# Altium footprint library TarabusLibrary.PcbLib: 591 footprints (part 19 of 37)
Each footprint in its own frame and in the unit in brackets; x right, y up, seen from the top. Pads: shape width x height; smd on the part's side, far side on the other; paste and mask are expansions set on the pad; w line width, h text height; cw(c..) or ccw(c..) is an arc to the next point about the centre after c.
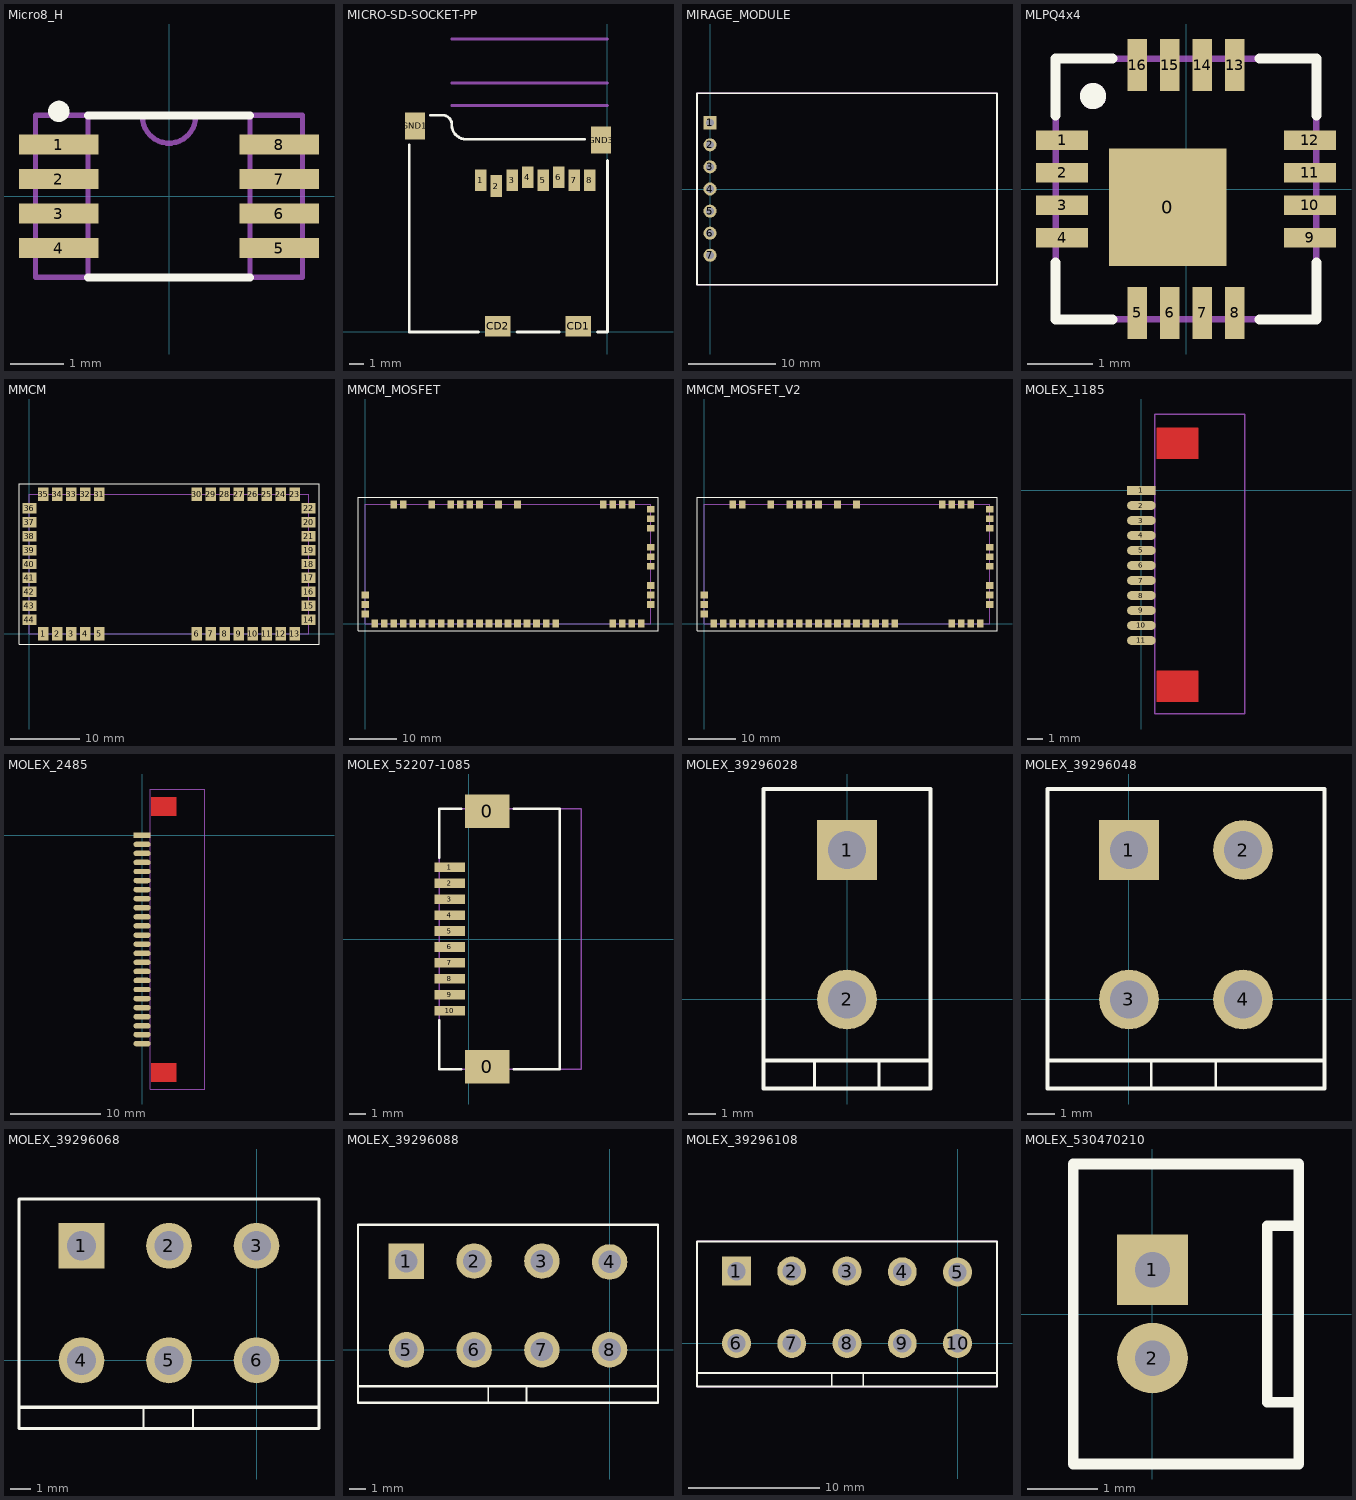
[diagram p18: the footprints below, top view; thin cyan lines are the x and y axes]

## Micro8_H [mm]
height 1.11
pads (8):
  rect 1.5x0.38 smd: 1(-2.075,0.975) 2(-2.075,0.325) 3(-2.075,-0.325) 4(-2.075,-0.975) 5(2.075,-0.975) 6(2.075,-0.325) 7(2.075,0.325) 8(2.075,0.975)
Top Overlay:
  circle w0.2: c-2.075,1.6 r0.1
  lines w0.15: -1.525,-1.525 1.525,-1.525 ; -1.525,1.525 1.525,1.525
Mechanical 7:
  lines w0.1: -1.525,-1.525 -1.525,1.525 ; -0.499,1.525 ccw(c0,1.5) 0.499,1.525 ; 1.525,-1.525 1.525,1.525 ; -2.515,-1.525 -2.515,1.525 2.515,1.525 2.515,-1.525 -2.515,-1.525
Mechanical 10:
  text ".Comment" at -0.67,-2.26 h0.6
  text ".Designator" at -0.67,2.04 h0.8
3D body: height 0.7, standoff 0, extent -2.515,-1.525 -1.525,1.525
3D body: height 0.7, standoff 0, extent 1.525,-1.525 2.515,1.525
3D body: height 1.11, standoff 0, extent -1.525,-1.525 1.525,1.525

## MICRO-SD-SOCKET-PP [mil] "MICRO-SD-SOCKET-PP"
pads (12):
  rect 32x60 smd: 1(-351.97,422) 2(-308.66,406) 3(-265.35,422) 4(-222.05,430) 5(-178.74,422) 6(-135.43,430) 7(-92.13,422) 8(-48.82,422)
  rect 71x56 smd: CD1(-80.71,16) CD2(-305.12,16)
  rect 56x75 smd: GND1(-535.43,573) GND3(-17.72,534)
Top Overlay:
  lines w8: -551.18,520 -551.18,0 -358.27,0 ; -492.13,603 -460.63,603 cw(c-458.85,577.19) -433.07,575 ccw(c-392.91,576.17) -393.7,536 -62.99,536 ; -251.97,0 -133.86,0 ; -27.56,0 0,0 0,477
Mechanical 2:
  text ">Name" at -350,250 h49.6
Mechanical 4:
  text ">Value" at -350,200 h49.6
Mechanical 16:
  lines w8: -433.07,630 0,630 ; -433.07,693 0,693 ; -433.07,815 0,815

## MIRAGE_MODULE [mm]
pads (7):
  rect 1.5x1.5 hole 0.9: 1(0,7.62)
  round 1.5 hole 0.9: 2(0,5.08) 3(0,2.54) 4(0,0) 5(0,-2.54) 6(0,-5.08) 7(0,-7.62)
Top Overlay:
  lines w0.2: -1.5,-11 33,-11 33,11 -1.5,11 -1.5,-11
Mechanical 7:
  lines w0.2: -1.5,-11 -1.5,11 33,11 33,-11 -1.5,-11
3D body: height 7, standoff 3, extent 2,-11 33,11
3D body: height 3, standoff 0, extent -1.5,-11 2,11
3D body: height 4, standoff 3, extent -1.5,-11 2,11
3D body: height 5, standoff -3, extent -0.3,7.3 0.3,7.9
3D body: height 5, standoff -3, extent -0.3,4.78 0.3,5.38
3D body: height 5, standoff -3, extent -0.3,2.22 0.3,2.82
3D body: height 5, standoff -3, extent -0.3,-0.32 0.3,0.28
3D body: height 5, standoff -3, extent -0.3,-2.86 0.3,-2.26
3D body: height 5, standoff -3, extent -0.3,-5.4 0.3,-4.8
3D body: height 5, standoff -3, extent -0.3,-7.94 0.3,-7.34

## MLPQ4x4 [mm]
height 1
pads (17):
  rect 1.8x1.8 smd: 0(-0.28,-0.28)
  rect 0.8x0.3 smd: 1(-1.9,0.75) 2(-1.9,0.25) 3(-1.9,-0.25) 4(-1.9,-0.75) 9(1.9,-0.75) 10(1.9,-0.25) 11(1.9,0.25) 12(1.9,0.75)
  rect 0.3x0.8 smd: 5(-0.75,-1.9) 6(-0.25,-1.9) 7(0.25,-1.9) 8(0.75,-1.9) 13(0.75,1.9) 14(0.25,1.9) 15(-0.25,1.9) 16(-0.75,1.9)
Top Overlay:
  circle w0.2: c-1.425,1.425 r0.1
  lines w0.15: -2,-1.125 -2,-2 -1.125,-2 ; -2,1.125 -2,2 -1.125,2 ; 1.125,-2 2,-2 2,-1.125 ; 1.125,2 2,2 2,1.125
Mechanical 7:
  circle w0.2: c-1.425,1.425 r0.1
  lines w0.1: -2,-2 2,-2 2,2 -2,2 -2,-2
Mechanical 10:
  text ".Designator" at -1.05,3.425 h0.8
  text ".Comment" at -0.65,2.775 h0.6
3D body: height 1, standoff 0, extent -2,-2 2,2

## MMCM [mm]
height 4
pads (44):
  rect 1.5x2 smd mask+0.075: 1(2,0) 2(4,0) 3(6,0) 4(8,0) 5(10,0) 6(24,0) 7(26,0) 8(28,0) 9(30,0) 10(32,0) 11(34,0) 12(36,0) 13(38,0) 23(38,20) 24(36,20) 25(34,20) 26(32,20) 27(30,20) 28(28,20) 29(26,20) 30(24,20) 31(10,20) 32(8,20) 33(6,20) 34(4,20) 35(2,20)
  rect 2x1.5 smd mask+0.075: 14(40,2) 15(40,4) 16(40,6) 17(40,8) 18(40,10) 19(40,12) 20(40,16) 21(40,14) 22(40,18) 36(0,18) 37(0,16) 38(0,14) 39(0,12) 40(0,10) 41(0,8) 42(0,6) 43(0,4) 44(0,2)
Top Overlay:
  lines w0.1: -1.5,-1.5 -1.5,21.5 41.5,21.5 41.5,-1.5 -1.5,-1.5
Mechanical 7:
  lines w0.1: 0,0 40,0 40,20 0,20 0,0
Mechanical 10:
  text ".Designator" at 18.373,10 h1
  text ".Comment" at 18.373,13 h1
3D body "MMCM_V1.step": height 4.6, standoff 0.32, extent 0,0 40,20

## MMCM_MOSFET [mm]
height 4
pads (49):
  rect 1.6x1.4 smd mask+0.075: 1(0,6) 2(0,4) 3(0,2) 28(60,4) 29(60,6) 30(60,8) 31(60,12) 32(60,14) 33(60,16) 34(60,20) 35(60,22) 36(60,24)
  rect 1.4x1.6 smd mask+0.075: 4(2,0) 5(4,0) 6(6,0) 7(8,0) 8(10,0) 9(12,0) 10(14,0) 11(16,0) 12(18,0) 13(20,0) 14(22,0) 15(24,0) 16(26,0) 17(28,0) 18(30,0) 19(32,0) 20(34,0) 21(36,0) 22(38,0) 23(40,0) 24(52,0) 25(54,0) 26(56,0) 27(58,0) 37(56,25) 38(54,25) 39(52,25) 40(50,25) 41(32,25) 42(28,25) 43(24,25) 44(22,25) 45(20,25) 46(18,25) 47(14,25) 48(8,25) 49(6,25)
Top Overlay:
  lines w0.1: -1.5,-1.5 61.5,-1.5 61.5,26.5 -1.5,26.5 -1.5,-1.5
Mechanical 7:
  lines w0.1: 0,0 0,25 60,25 60,0 0,0
Mechanical 10:
  text ".Comment" at 8,27.695 h1
  text ".Designator" at 2,27.695 h1
3D body "MMCM_MOSFET.step": height 3.6, standoff 0.03, extent 0,0 60,25

## MMCM_MOSFET_V2 [mm]
height 4
pads (49):
  rect 1.6x1.4 smd mask+0.075: 1(0,6) 2(0,4) 3(0,2) 28(60,20) 29(60,22) 30(60,24) 31(60,12) 32(60,14) 33(60,16) 34(60,4) 35(60,6) 36(60,8)
  rect 1.4x1.6 smd mask+0.075: 2(54,25) 4(2,0) 5(4,0) 6(6,0) 7(8,0) 8(10,0) 9(12,0) 10(14,0) 11(20,0) 12(16,0) 13(18,0) 14(22,0) 15(24,0) 16(36,0) 17(32,0) 18(34,0) 19(30,0) 20(18,25) 21(6,25) 22(28,25) 23(32,25) 24(8,25) 25(56,25) 27(50,25) 27(52,25) 37(52,0) 37(54,0) 38(56,0) 39(58,0) 40(14,25) 41(24,25) 42(20,25) 43(22,25) 44(40,0) 45(38,0) 46(26,0) 47(28,0)
Top Overlay:
  lines w0.1: -1.5,-1.5 61.5,-1.5 61.5,26.5 -1.5,26.5 -1.5,-1.5
Mechanical 7:
  lines w0.1: 0,0 0,25 60,25 60,0 0,0
Mechanical 10:
  text ".Comment" at 8,27.695 h1
  text ".Designator" at 2,27.695 h1
3D body "MMCM_MOSFET.step": height 3.6, standoff 0.03, extent 0,0 60,25

## MOLEX_1185 [mm]
pads (11):
  rect 1.9x0.6 smd: 1(0,0)
  oval 1.9x0.6 smd: 2(0,-1) 3(0,-2) 4(0,-3) 5(0,-4) 6(0,-5) 7(0,-6) 8(0,-7) 9(0,-8) 10(0,-9) 11(0,-10)
Top Layer:
  rectangle: 1,2.1 3.8,4.2
  rectangle: 1,-14.108 3.8,-12.008
Top Solder:
  rectangle: 0.9,2 3.9,4.3
  rectangle: 0.9,-14.208 3.9,-11.908
Mechanical 1:
  lines w0.1: 0.9,-14.9 0.9,5.1 6.9,5.1 6.9,-14.9 0.9,-14.9

## MOLEX_2485 [mm]
pads (24):
  rect 1.9x0.6 smd: 1(0,0)
  oval 1.9x0.6 smd: 2(0,-1) 3(0,-2) 4(0,-3) 5(0,-4) 6(0,-5) 7(0,-6) 8(0,-7) 9(0,-8) 10(0,-9) 11(0,-10) 12(0,-11.025) 13(0,-12.025) 14(0,-13.025) 15(0,-14.025) 16(0,-15.025) 17(0,-16.025) 18(0,-17.025) 19(0,-18.025) 20(0,-19.025) 21(0,-20.025) 22(0,-21.025) 23(0,-22) 24(0,-23)
Top Layer:
  rectangle: 1,-27.208 3.8,-25.108
  rectangle: 1,2.1 3.8,4.2
Top Solder:
  rectangle: 0.9,-27.308 3.9,-25.008
  rectangle: 0.9,2 3.9,4.3
Mechanical 1:
  lines w0.1: 0.9,-28 6.9,-28 6.9,5.1 0.9,5.1 0.9,-28

## MOLEX_52207-1085 [mm]
height 2.7
pads (12):
  rect 2.8x2.1 smd: 0(1.175,-8) 0(1.175,8)
  rect 1.9x0.6 smd: 1(-1.175,4.5) 2(-1.175,3.5) 3(-1.175,2.5) 4(-1.175,1.5) 5(-1.175,0.5) 6(-1.175,-0.5) 7(-1.175,-1.5) 8(-1.175,-2.5) 9(-1.175,-3.5) 10(-1.175,-4.5)
Top Overlay:
  lines w0.15: -1.825,-5.075 -1.825,-8.15 -0.45,-8.15 ; -1.825,5.075 -1.825,8.15 -0.45,8.15 ; 2.825,-8.15 5.725,-8.15 5.725,8.15 2.825,8.15
Mechanical 7:
  lines w0.1: -1.825,-8.15 -1.825,8.15 7.075,8.15 7.075,-8.15 -1.825,-8.15
Mechanical 10:
  text ".Designator" at 0.795,10.18 h0.8
  text ".Comment" at 0.805,9.61 h0.6
3D body "522071085.STEP": height 2.69, standoff -0.01, extent -1.825,-8.15 7.075,8.15

## MOLEX_39296028 [mm]
pads (2):
  rect 2.2x2.2 hole 1.4: 1(0,5.5)
  round 2.2 hole 1.4: 2(0,0)
Top Overlay:
  lines w0.1: -1.2,-3.275 -1.2,-2.25 ; 1.175,-3.275 1.175,-2.25 ; 1.2,-3.275 1.225,-3.3
  lines w0.15: -3.075,-2.25 3.075,-2.25 ; -3.075,-3.275 3.075,-3.275 3.075,7.75 -3.075,7.75 -3.075,-3.275
Mechanical 7:
  lines w0.1: -3.075,-2.25 -3.075,7.75 3.075,7.75 3.075,-2.25 -3.075,-2.25
Mechanical 10:
  text ".Designator" at -1.28,4.98 h0.8
  text ".Comment" at -1.27,4.41 h0.6
3D body "039281023.stp": height 12.8, standoff -3.5, extent -3.1,-3.2 3.1,7.8

## MOLEX_39296048 [mm]
pads (4):
  rect 2.2x2.2 hole 1.4: 1(0,5.5)
  round 2.2 hole 1.4: 2(4.2,5.5) 3(0,0) 4(4.2,0)
Top Overlay:
  lines w0.1: 0.825,-3.275 0.825,-2.25 ; 3.2,-3.275 3.2,-2.25 ; 3.225,-3.275 3.25,-3.3
  lines w0.15: -3,-2.25 7.2,-2.25 ; -3,-3.275 -3,7.75 7.2,7.75 7.2,-3.275 -3,-3.275
Mechanical 7:
  lines w0.1: -3,-3.275 7.2,-3.275 7.2,7.75 -3,7.75 -3,-3.275
Mechanical 10:
  text ".Comment" at 3.775,8.25 h0.6
  text ".Designator" at -1.275,8.175 h0.8

## MOLEX_39296068 [mm]
pads (6):
  rect 2.2x2.2 hole 1.4: 1(-8.4,5.5)
  round 2.2 hole 1.4: 2(-4.2,5.5) 3(0,5.5) 4(-8.4,0) 5(-4.2,0) 6(0,0)
Top Overlay:
  lines w0.1: -5.425,-3.275 -5.425,-2.25 ; -3.05,-3.275 -3.05,-2.25 ; -3.025,-3.275 -3,-3.3
  lines w0.15: -11.4,-2.25 3,-2.25 ; -11.4,-3.275 -11.4,7.75 3,7.75 3,-3.275 -11.4,-3.275
Mechanical 7:
  lines w0.1: -11.4,-3.275 3,-3.275 3,7.75 -11.4,7.75 -11.4,-3.275
Mechanical 10:
  text ".Comment" at -4.625,8.25 h0.6
  text ".Designator" at -9.675,8.175 h0.8

## MOLEX_39296088 [mm]
pads (8):
  rect 2.2x2.2 hole 1.4: 1(-12.6,5.5)
  round 2.2 hole 1.4: 2(-8.4,5.5) 3(-4.2,5.5) 4(0,5.45) 5(-12.6,0) 6(-8.4,0) 7(-4.2,0) 8(0,0)
Top Overlay:
  lines w0.1: -7.525,-3.287 -7.525,-2.262 ; -5.15,-3.288 -5.15,-2.262 ; -5.125,-3.288 -5.1,-3.313
  lines w0.15: -15.6,-2.25 3,-2.25 ; -15.6,-3.275 3,-3.275 3,7.75 -15.6,7.75 -15.6,-3.275
Mechanical 7:
  lines w0.1: -15.6,-3.275 -15.6,7.75 3,7.75 3,-3.275 -15.6,-3.275
Mechanical 10:
  text ".Designator" at -13.875,8.175 h0.8
  text ".Comment" at -8.825,8.25 h0.6

## MOLEX_39296108 [mm]
pads (10):
  rect 2.2x2.2 hole 1.4: 1(-16.8,5.5)
  round 2.2 hole 1.4: 2(-12.6,5.5) 3(-8.4,5.5) 4(-4.2,5.45) 5(0,5.425) 6(-16.8,0) 7(-12.6,0) 8(-8.4,0) 9(-4.2,0) 10(0,0)
Top Overlay:
  lines w0.1: -9.575,-3.263 -9.575,-2.238 ; -7.175,-3.263 -7.175,-2.238
  lines w0.15: -19.8,-2.25 3,-2.25 ; -19.8,-3.275 -19.8,7.75 3,7.75 3,-3.275 -19.8,-3.275
Mechanical 7:
  lines w0.1: -19.8,-3.275 3,-3.275 3,7.75 -19.8,7.75 -19.8,-3.275
Mechanical 10:
  text ".Comment" at -13.025,8.25 h0.6
  text ".Designator" at -18.075,8.175 h0.8

## MOLEX_530470210 [mm]
height 4.2
pads (2):
  rect 1x1 hole 0.5 mask+0.15: 1(0,0.625)
  round 1 hole 0.5 mask+0.15: 2(0,-0.625)
Top Overlay:
  lines w0.15: 2.075,-1.25 1.625,-1.25 1.625,1.25 2.075,1.25 ; -1.125,-2.125 -1.125,2.125 2.075,2.125 2.075,-2.125 -1.125,-2.125
Mechanical 7:
  lines w0.1: 2.075,-1.25 1.625,-1.25 1.625,1.25 2.075,1.25 ; -1.125,-2.125 2.075,-2.125 2.075,2.125 -1.125,2.125 -1.125,-2.125
Mechanical 10:
  text ".Comment" at -0.77,2.485 h0.6
  text ".Designator" at -0.78,3.055 h0.8
3D body "530470210.STEP": height 4.22, standoff -2.18, extent -1.125,-2.125 2.075,2.125